# Altium footprint library ICs And Semiconductors SMD.PcbLib: 602 footprints (part 25 of 38)
Each footprint in its own frame and in the unit in brackets; x right, y up, seen from the top. Pads: shape width x height; smd on the part's side, far side on the other; paste and mask are expansions set on the pad; w line width, h text height; cw(c..) or ccw(c..) is an arc to the next point about the centre after c.
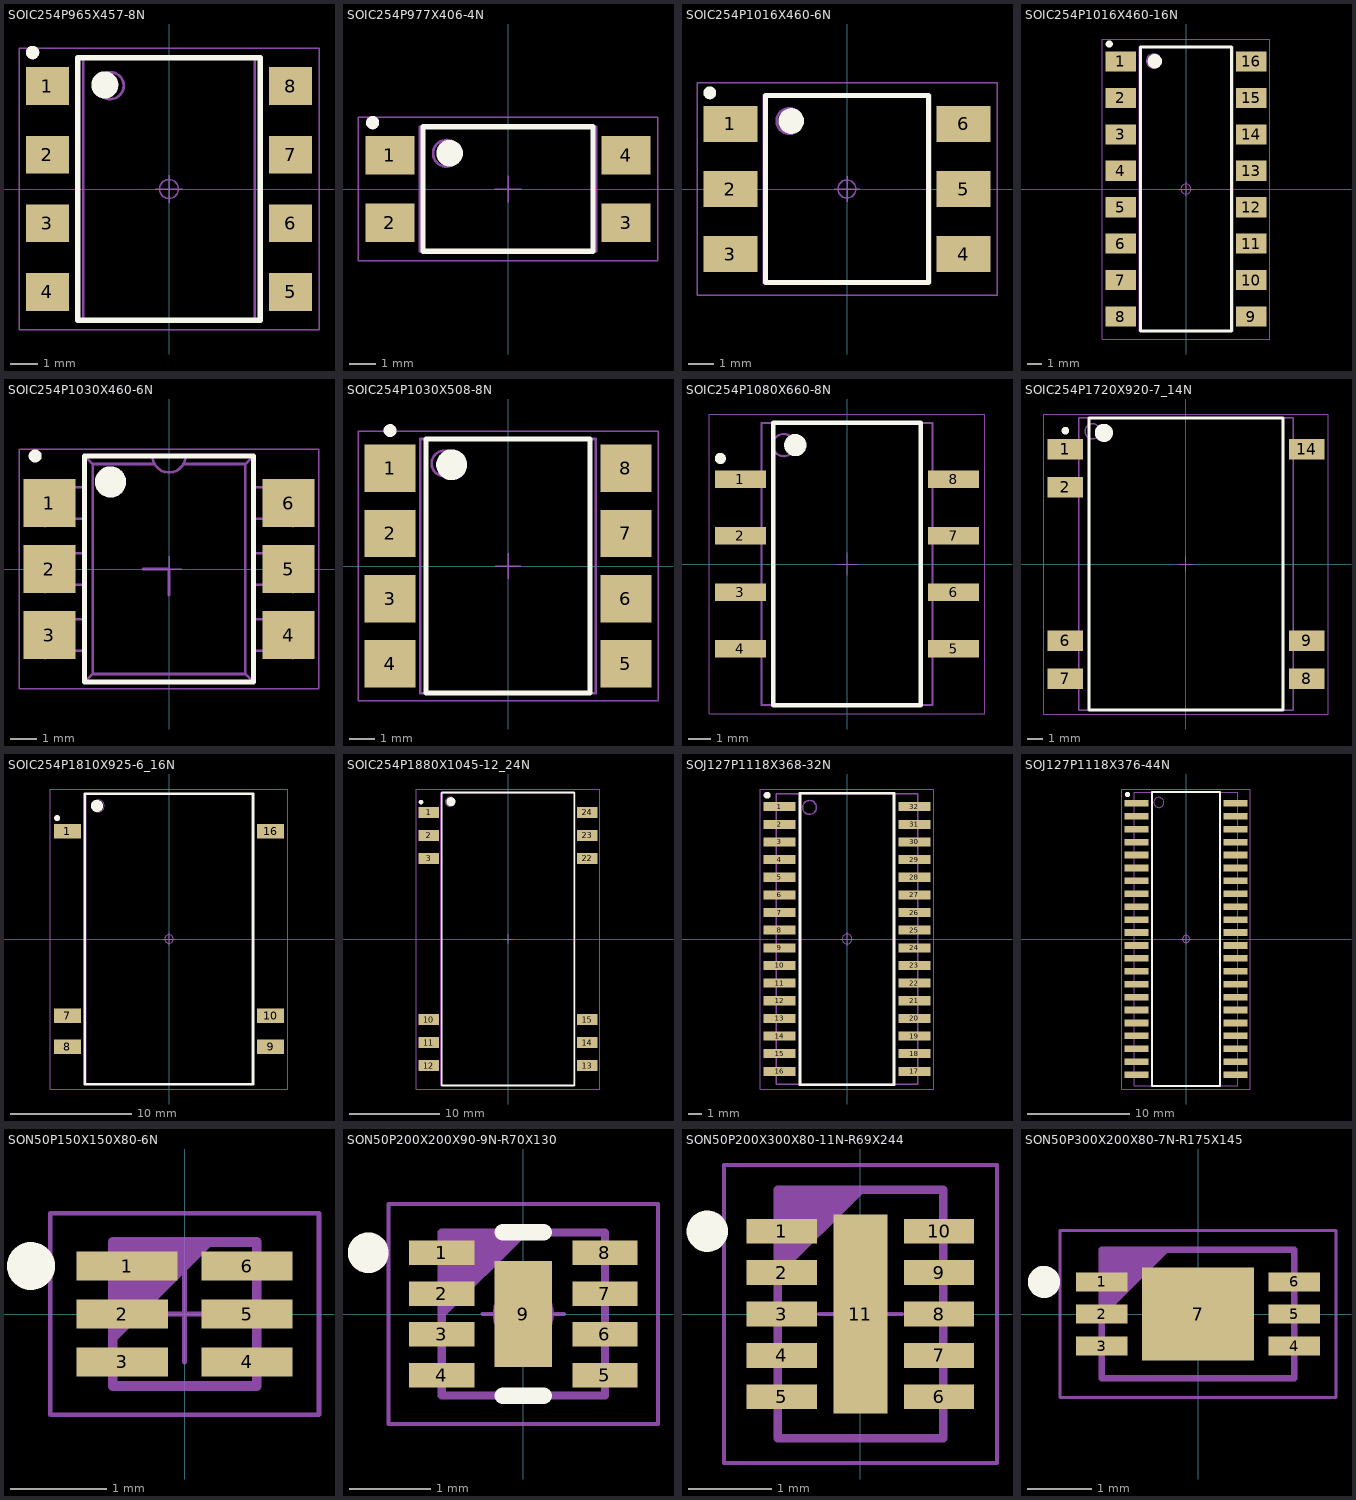
[diagram p24: the footprints below, top view; thin cyan lines are the x and y axes]

## SOIC254P965X457-8N [mm] "DIP Gull Wing Surface Mount, 8-Leads, Body 9.65 x 6.35mm (nom), Pitch 2.54mm, IPC Medium Density"
height 4.57
pads (8):
  rect 1.6x1.4 smd: 1(-4.5,3.81) 2(-4.5,1.27) 3(-4.5,-1.27) 4(-4.5,-3.81) 5(4.5,-3.81) 6(4.5,-1.27) 7(4.5,1.27) 8(4.5,3.81)
Top Overlay:
  circle w0.25: c-5.05,5.05 r0.125
  circle w0.5: c-2.375,3.85 r0.25
  lines w0.2: -3.375,-4.85 -3.375,4.85 3.375,4.85 3.375,-4.85 -3.375,-4.85
Mechanical 14:
  circle w0.1: c-2.175,3.825 r0.5
  lines w0.1: -3.175,-4.825 -3.175,4.825 3.175,4.825 3.175,-4.825 -3.175,-4.825
Mechanical 15:
  circle w0.05: c0,0 r0.35
  lines w0.05: -0.5,0 0.5,0 ; 0,-0.5 0,0.5 ; -5.55,-5.2 -5.55,5.2 5.55,5.2 5.55,-5.2 -5.55,-5.2
3D body "SOIC254P965X457-8N.stp": height 4.57, standoff -0.02, extent -4.81,-4.94 4.81,4.97

## SOIC254P977X406-4N [mm] "SOIC, 2.54mm pitch; 4 pin, 6.65mm W X 4.69mm L, IPC Medium Density"
height 4.06
pads (4):
  rect 1.85x1.45 smd: 1(-4.45,1.27) 2(-4.45,-1.27) 3(4.45,-1.27) 4(4.45,1.27)
Top Overlay:
  circle w0.5: c-2.2,1.35 r0.25
  circle w0.25: c-5.1,2.5 r0.125
  lines w0.2: -3.2,-2.35 3.2,-2.35 3.2,2.35 -3.2,2.35 -3.2,-2.35
Mechanical 14:
  circle w0.1: c-2.322,1.345 r0.5
  lines w0.1: -3.322,-2.345 -3.322,2.345 3.322,2.345 3.322,-2.345 -3.322,-2.345
Mechanical 15:
  lines w0.05: -0.5,0 0.5,0 ; 0,-0.5 0,0.5 ; -5.65,-2.7 -5.65,2.7 5.65,2.7 5.65,-2.7 -5.65,-2.7
3D body "SOIC254P977X406-4N.stp": height 4.06, standoff 0, extent -5.015,-2.415 5.015,2.415

## SOIC254P1016X460-6N [mm] "DIP Gull Wing Surface Mount, 6-Leads, Body 7.3x6.5mm, Pitch 2.54mm, IPC Medium Density"
height 4.6
pads (6):
  rect 2.1x1.4 smd: 1(-4.55,2.54) 2(-4.55,0) 3(-4.55,-2.54) 4(4.55,-2.54) 5(4.55,0) 6(4.55,2.54)
Top Overlay:
  circle w0.25: c-5.35,3.75 r0.125
  circle w0.5: c-2.175,2.65 r0.25
  lines w0.2: -3.175,-3.65 -3.175,3.65 3.175,3.65 3.175,-3.65 -3.175,-3.65
Mechanical 14:
  circle w0.1: c-2.25,2.65 r0.5
  lines w0.1: -3.25,-3.65 -3.25,3.65 3.25,3.65 3.25,-3.65 -3.25,-3.65
Mechanical 15:
  circle w0.05: c0,0 r0.35
  lines w0.05: -0.5,0 0.5,0 ; 0,-0.5 0,0.5 ; -5.85,-4.15 -5.85,4.15 5.85,4.15 5.85,-4.15 -5.85,-4.15
3D body "SOIC254P1016X460-6N.stp": height 4.6, standoff 0, extent -5.15,-3.9 5.15,3.9

## SOIC254P1016X460-16N [mm] "SOIC, 2.54mm Pitch; 16 Pin, 6.50mm W X 19.84mm L X 4.60mm H body, Pitch 2.54mm, IPC Medium Density"
height 4.6
pads (16):
  rect 2.1x1.4 smd: 1(-4.55,8.89) 2(-4.55,6.35) 3(-4.55,3.81) 4(-4.55,1.27) 5(-4.55,-1.27) 6(-4.55,-3.81) 7(-4.55,-6.35) 8(-4.55,-8.89) 9(4.55,-8.89) 10(4.55,-6.35) 11(4.55,-3.81) 12(4.55,-1.27) 13(4.55,1.27) 14(4.55,3.81) 15(4.55,6.35) 16(4.55,8.89)
Top Overlay:
  circle w0.5: c-2.175,8.9 r0.25
  circle w0.25: c-5.35,10.1 r0.125
  lines w0.2: -3.175,-9.9 3.175,-9.9 3.175,9.9 -3.175,9.9 -3.175,-9.9
Mechanical 14:
  circle w0.1: c-2.25,8.92 r0.5
  lines w0.1: -3.25,-9.92 3.25,-9.92 3.25,9.92 -3.25,9.92 -3.25,-9.92
Mechanical 15:
  circle w0.05: c0,0 r0.35
  lines w0.05: -0.5,0 0.5,0 ; 0,-0.5 0,0.5 ; -5.85,-10.45 5.85,-10.45 5.85,10.45 -5.85,10.45 -5.85,-10.45
3D body "SOIC254P1016X460-16N.stp": height 4.6, standoff 0, extent -5.15,-10.17 5.15,10.17

## SOIC254P1030X460-6N [mm] "DIP Gull Wing Surface Mount, 6-Leads, Body 8.7x6.5mm (max), Pitch 2.54mm, IPC Medium Density"
height 4.6
pads (6):
  rect 2x1.85 smd: 1(-4.6,2.54) 2(-4.6,0) 3(-4.6,-2.54) 4(4.6,-2.54) 5(4.6,0) 6(4.6,2.54)
Top Overlay:
  circle w0.6: c-2.25,3.35 r0.3
  circle w0.25: c-5.15,4.35 r0.125
  lines w0.2: -3.25,-4.35 -3.25,4.35 3.25,4.35 3.25,-4.35 -3.25,-4.35
Mechanical 8:
  lines w0.1: -5.525,-2.54 -4.763,-2.54 -4.763,-3.43 ; -5.525,0 -4.763,0 -4.763,-0.89 ; -5.525,2.54 -4.763,2.54 -4.763,1.65 ; -3.25,-4.35 -2.941,-4.041 ; -3.25,-3.15 -4,-3.15 -4.09,-2.815 -5.15,-2.815 -5.15,-2.265 -4.09,-2.265 -4,-1.93 -3.25,-1.93 ; -3.25,-0.61 -4,-0.61 -4.09,-0.275 -5.15,-0.275 -5.15,0.275 -4.09,0.275 -4,0.61 -3.25,0.61 ; -3.25,1.93 -4,1.93 -4.09,2.265 -5.15,2.265 -5.15,2.815 -4.09,2.815 -4,3.15 -3.25,3.15 ; -3.25,4.35 -2.941,4.041 ; -1,0 0,0 0,-1 ; -0.635,4.35 ccw(c0,4.35) 0.635,4.35 ; -0.554,4.041 -2.941,4.041 ; 0.554,4.041 2.941,4.041 ; 3.25,-4.35 2.941,-4.041 ; 3.25,-3.15 4,-3.15 4.09,-2.815 5.15,-2.815 5.15,-2.265 4.09,-2.265 4,-1.93 3.25,-1.93 ; 3.25,-0.61 4,-0.61 4.09,-0.275 5.15,-0.275 5.15,0.275 4.09,0.275 4,0.61 3.25,0.61 ; 3.25,1.93 4,1.93 4.09,2.265 5.15,2.265 5.15,2.815 4.09,2.815 4,3.15 3.25,3.15 ; 3.25,4.35 2.941,4.041 ; 4,-2.54 4.763,-2.54 4.763,-3.43 ; 4,0 4.763,0 4.763,-0.89 ; 4,2.54 4.763,2.54 4.763,1.65 ; -2.941,-4.041 -2.941,4.041 ; -2.941,-4.041 2.941,-4.041 ; 2.941,-4.041 2.941,4.041
Mechanical 14:
  circle w0.1: c-2.25,3.35 r0.5
  lines w0.1: -3.25,-4.35 -3.25,4.35 3.25,4.35 3.25,-4.35 -3.25,-4.35
Mechanical 15:
  lines w0.05: -5.773,4.6 -5.773,-4.6 5.773,-4.6 5.773,4.6 -5.75,4.6 ; -0.5,0 0.5,0 ; 0,-0.5 0,0.5
3D body "SOIC254P1030X460-6N.stp": height 4.6, standoff 0, extent -5.15,-4.35 5.15,4.35

## SOIC254P1030X508-8N [mm] "DIP Gull Wing Surface Mount, 8-Leads, Body 9.9x6.9mm (max), Pitch 2.54mm, IPC Medium Density"
height 5.08
pads (8):
  rect 2x1.85 smd: 1(-4.6,3.81) 2(-4.6,1.27) 3(-4.6,-1.27) 4(-4.6,-3.81) 5(4.6,-3.81) 6(4.6,-1.27) 7(4.6,1.27) 8(4.6,3.81)
Top Overlay:
  circle w0.6: c-2.2,3.95 r0.3
  circle w0.25: c-4.6,5.285 r0.125
  lines w0.2: -3.2,-4.95 3.2,-4.95 3.2,4.95 -3.2,4.95 -3.2,-4.95
Mechanical 14:
  circle w0.1: c-2.48,4.005 r0.5
  lines w0.1: -3.43,-4.955 3.43,-4.955 3.43,4.955 -3.43,4.955 -3.43,-4.955
Mechanical 15:
  lines w0.05: -0.5,0 0.5,0 ; 0,-0.5 0,0.5 ; -5.85,-5.25 5.85,-5.25 5.85,5.25 -5.85,5.25 -5.85,-5.25
3D body "SOIC254P1030X508-8N.stp": height 5.08, standoff 0, extent -5.15,-4.955 5.15,4.955

## SOIC254P1080X660-8N [mm] "SOIC, 2.54mm,pitch; 8 pin, 7.70mm W X 12.70mm L X 6.60mm H body, IPC Medium Density"
height 6.6
pads (8):
  rect 2.3x0.8 smd: 1(-4.8,3.81) 2(-4.8,1.27) 3(-4.8,-1.27) 4(-4.8,-3.81) 5(4.8,-3.81) 6(4.8,-1.27) 7(4.8,1.27) 8(4.8,3.81)
Top Overlay:
  circle w0.25: c-5.7,4.75 r0.125
  circle w0.5: c-2.325,5.35 r0.25
  lines w0.2: -3.325,-6.35 -3.325,6.35 3.325,6.35 3.325,-6.35 -3.325,-6.35
Mechanical 14:
  circle w0.1: c-2.85,5.35 r0.5
  lines w0.1: -3.85,-6.35 -3.85,6.35 3.85,6.35 3.85,-6.35 -3.85,-6.35
Mechanical 15:
  lines w0.05: -0.5,0 0.5,0 ; 0,-0.5 0,0.5 ; -6.2,-6.75 -6.2,6.75 6.2,6.75 6.2,-6.75 -6.2,-6.75
3D body "SOIC254P1080X660-8N.stp": height 6.6, standoff 0, extent -5.626,-6.475 5.626,6.475

## SOIC254P1720X920-7_14N [mm] "SOIC, 2.54mm pitch; 7 of 14 pin, 13.70mm W X 18.90mm L X 9.20mm H body, IPC Medium Density"
height 9.2
pads (7):
  rect 2.35x1.35 smd: 1(-8,7.62) 2(-8,5.08) 6(-8,-5.08) 7(-8,-7.62) 8(8,-7.62) 9(8,-5.08) 14(8,7.62)
Top Overlay:
  circle w0.6: c-5.45,8.7 r0.3
  circle w0.25: c-8,8.845 r0.125
  lines w0.2: -6.45,-9.7 6.45,-9.7 6.45,9.7 -6.45,9.7 -6.45,-9.7
Mechanical 14:
  circle w0.1: c-6.2,8.8 r0.5
  lines w0.1: -7.1,-9.7 7.1,-9.7 7.1,9.7 -7.1,9.7 -7.1,-9.7
Mechanical 15:
  lines w0.05: -0.5,0 0.5,0 ; 0,-0.5 0,0.5 ; -9.45,-9.95 9.45,-9.95 9.45,9.95 -9.45,9.95 -9.45,-9.95
3D body "DCDC_TRACO_TMR1SM.stp": height 9.45, standoff 0, extent -8.85,-9.7 8.85,9.7

## SOIC254P1810X925-6_16N [mm] "SOIC, 2.54mm, pitch; 6 pin, 13.70mm W X 24.00mm L X 9.25mm H body, IPC Medium Density"
height 9.25
pads (6):
  rect 2.25x1.2 smd: 1(-8.4,8.89) 7(-8.4,-6.35) 8(-8.4,-8.89) 9(8.4,-8.89) 10(8.4,-6.35) 16(8.4,8.89)
Top Overlay:
  circle w0.25: c-9.25,10 r0.125
  circle w0.5: c-5.95,11 r0.25
  lines w0.2: -6.95,-12 -6.95,12 6.95,12 6.95,-12 -6.95,-12
Mechanical 14:
  circle w0.1: c-5.85,11 r0.5
  lines w0.1: -6.85,-12 -6.85,12 6.85,12 6.85,-12 -6.85,-12
Mechanical 15:
  circle w0.05: c0,0 r0.35
  lines w0.05: -0.5,0 0.5,0 ; 0,-0.5 0,0.5 ; -9.8,-12.4 -9.8,12.4 9.8,12.4 9.8,-12.4 -9.8,-12.4
3D body "SOIC254P1810X925-6_16N.stp": height 10.45, standoff 0, extent -9.05,-12 9.05,12

## SOIC254P1880X1045-12_24N [mm] "SOIC, 2.54mm Pitch, 12 Pin of 24, 14.8 W X 32.3mm L X 10.45mm H, IPC Medium Density"
height 10.45
pads (12):
  rect 2.25x1.2 smd: 1(-8.75,13.97) 2(-8.75,11.43) 3(-8.75,8.89) 10(-8.75,-8.89) 11(-8.75,-11.43) 12(-8.75,-13.97) 13(8.75,-13.97) 14(8.75,-11.43) 15(8.75,-8.89) 22(8.75,8.89) 23(8.75,11.43) 24(8.75,13.97)
Top Overlay:
  circle w0.5: c-6.3,15.15 r0.25
  circle w0.25: c-9.6,15.1 r0.125
  lines w0.2: -7.3,-16.15 7.3,-16.15 7.3,16.15 -7.3,16.15 -7.3,-16.15
Mechanical 14:
  circle w0.1: c-6.4,15.15 r0.5
  lines w0.1: -7.4,-16.15 7.4,-16.15 7.4,16.15 -7.4,16.15 -7.4,-16.15
Mechanical 15:
  lines w0.05: -0.5,0 0.5,0 ; 0,-0.5 0,0.5 ; -10.15,-16.55 10.15,-16.55 10.15,16.55 -10.15,16.55 -10.15,-16.55
3D body "SOIC254P1880X1045-12_24N.stp": height 10.45, standoff 0, extent -9.4,-16.15 9.4,16.15

## SOJ127P1118X368-32N [mm] "SO J-Lead, 1.27mm, Pitch; 32 Pin, 10.16mm W X 20.95mm L X 3.68mm H body, IPC Medium Density"
height 3.68
pads (32):
  rect 2.3x0.65 smd: 1(-4.85,9.525) 2(-4.85,8.255) 3(-4.85,6.985) 4(-4.85,5.715) 5(-4.85,4.445) 6(-4.85,3.175) 7(-4.85,1.905) 8(-4.85,0.635) 9(-4.85,-0.635) 10(-4.85,-1.905) 11(-4.85,-3.175) 12(-4.85,-4.445) 13(-4.85,-5.715) 14(-4.85,-6.985) 15(-4.85,-8.255) 16(-4.85,-9.525) 17(4.85,-9.525) 18(4.85,-8.255) 19(4.85,-6.985) 20(4.85,-5.715) 21(4.85,-4.445) 22(4.85,-3.175) 23(4.85,-1.905) 24(4.85,-0.635) 25(4.85,0.635) 26(4.85,1.905) 27(4.85,3.175) 28(4.85,4.445) 29(4.85,5.715) 30(4.85,6.985) 31(4.85,8.255) 32(4.85,9.525)
Top Overlay:
  circle w0.25: c-5.75,10.35 r0.125
  lines w0.2: -3.375,-10.5 -3.375,10.5 3.375,10.5 3.375,-10.5 -3.375,-10.5
Mechanical 14:
  circle w0.1: c-2.7,9.475 r0.5
  lines w0.1: -5.08,-10.475 -5.08,10.475 5.08,10.475 5.08,-10.475 -5.08,-10.475
Mechanical 15:
  circle w0.05: c0,0 r0.35
  lines w0.05: -0.5,0 0.5,0 ; 0,-0.5 0,0.5 ; -6.25,-10.8 -6.25,10.8 6.25,10.8 6.25,-10.8 -6.25,-10.8
3D body "SOJ127P1118X368-32N.stp": height 3.68, standoff 0, extent -5.587,-10.54 5.588,10.54

## SOJ127P1118X376-44N [mm] "SO J-Lead, 1.27mm Pitch; 44 Pin, 10.16mm W X 28.86mm L X 3.76mm H Body, IPC Medium Density"
height 1.2
pads (44):
  rect 2.35x0.65 smd: 1(-4.85,13.335) 2(-4.85,12.065) 3(-4.85,10.795) 4(-4.85,9.525) 5(-4.85,8.255) 6(-4.85,6.985) 7(-4.85,5.715) 8(-4.85,4.445) 9(-4.85,3.175) 10(-4.85,1.905) 11(-4.85,0.635) 12(-4.85,-0.635) 13(-4.85,-1.905) 14(-4.85,-3.175) 15(-4.85,-4.445) 16(-4.85,-5.715) 17(-4.85,-6.985) 18(-4.85,-8.255) 19(-4.85,-9.525) 20(-4.85,-10.795) 21(-4.85,-12.065) 22(-4.85,-13.335) 23(4.85,-13.335) 24(4.85,-12.065) 25(4.85,-10.795) 26(4.85,-9.525) 27(4.85,-8.255) 28(4.85,-6.985) 29(4.85,-5.715) 30(4.85,-4.445) 31(4.85,-3.175) 32(4.85,-1.905) 33(4.85,-0.635) 34(4.85,0.635) 35(4.85,1.905) 36(4.85,3.175) 37(4.85,4.445) 38(4.85,5.715) 39(4.85,6.985) 40(4.85,8.255) 41(4.85,9.525) 42(4.85,10.795) 43(4.85,12.065) 44(4.85,13.335)
Top Overlay:
  circle w0.25: c-5.75,14.2 r0.125
  lines w0.2: -3.35,-14.45 3.35,-14.45 3.35,14.45 -3.35,14.45 -3.35,-14.45
Mechanical 14:
  circle w0.1: c-2.675,13.43 r0.5
  lines w0.1: -5.08,-14.43 5.08,-14.43 5.08,14.43 -5.08,14.43 -5.08,-14.43
Mechanical 15:
  circle w0.05: c0,0 r0.35
  lines w0.05: -0.5,0 0.5,0 ; 0,-0.5 0,0.5 ; -6.3,-14.75 6.3,-14.75 6.3,14.75 -6.3,14.75 -6.3,-14.75
3D body "SOJ127P1118X376-44N.stp": height 3.68, standoff 0, extent -5.587,-14.49 5.588,14.49

## SON50P150X150X80-6N [mm] "SON, 0.50mm pitch, 6 pin, 1.5mm X 1.5mm X 0.8mm H body,  IPC Medium Density"
height 0.8
pads (6):
  rect 1.05x0.3 smd: 1(-0.6,0.5)
  rect 0.95x0.3 smd: 2(-0.65,0) 3(-0.65,-0.5) 4(0.65,-0.5) 5(0.65,0) 6(0.65,0.5)
Top Overlay:
  circle w0.25: c-1.6,0.5 r0.125
Mechanical 14:
  lines w0.1: -0.75,-0.25 0.25,0.75 ; -0.75,-0.15 0.15,0.75 ; -0.75,-0.05 0.05,0.75 ; -0.75,0.05 -0.05,0.75 ; -0.75,0.15 -0.15,0.75 ; -0.75,0.25 -0.25,0.75 ; -0.75,0.35 -0.35,0.75 ; -0.75,0.45 -0.45,0.75 ; -0.75,0.55 -0.55,0.75 ; -0.75,0.65 -0.65,0.75 ; -0.75,-0.75 0.75,-0.75 0.75,0.75 -0.75,0.75 -0.75,-0.75
Mechanical 15:
  lines w0.05: -0.5,0 0.5,0 ; 0,-0.5 0,0.5 ; -1.4,-1.05 -1.4,1.05 1.4,1.05 1.4,-1.05 -1.4,-1.05
3D body "SON50P150X150X80-6N.stp": height 0.8, standoff 0, extent -0.774,-0.774 0.776,0.776

## SON50P200X200X90-9N-R70X130 [mm] "SON, 0.50mm Pitch; 8 Pin, 2.00mm W X 2.00mm L X 0.90mm H body (w/thermal tab 0.7 X 1.3 mm), IPC Medium Density"
height 1.1
pads (9):
  rect 0.8x0.3 smd: 1(-1,0.75) 2(-1,0.25) 3(-1,-0.25) 4(-1,-0.75) 5(1,-0.75) 6(1,-0.25) 7(1,0.25) 8(1,0.75)
  rect 0.7x1.3 smd paste-0.165: 9(0,0)
Top Overlay:
  circle w0.25: c-1.9,0.75 r0.125
  lines w0.2: -0.25,-1 0.25,-1 ; -0.25,1 0.25,1
Mechanical 14:
  lines w0.1: -1,0 0,1 ; -1,0.1 -0.1,1 ; -1,0.2 -0.2,1 ; -1,0.3 -0.3,1 ; -1,0.4 -0.4,1 ; -1,0.5 -0.5,1 ; -1,0.6 -0.6,1 ; -1,0.7 -0.7,1 ; -1,0.8 -0.8,1 ; -1,0.9 -0.9,1 ; -1,-1 1,-1 1,1 -1,1 -1,-1
Mechanical 15:
  circle w0.05: c0,0 r0.35
  lines w0.05: -0.5,0 0.5,0 ; 0,-0.5 0,0.5 ; -1.65,-1.35 -1.65,1.35 1.65,1.35 1.65,-1.35 -1.65,-1.35
3D body "SON50P200X200X90-9N-R70X130.stp": height 0.9, standoff 0, extent -1,-1 1,1

## SON50P200X300X80-11N-R69X244 [mm] "SON, 0.50mm Pitch, 10-pin, 2.00mm W  X 3mm L X 0.80mm Height, (w/thermal tab 0.69 X 2.44 mm), IPC Medium Density"
height 1.1
pads (11):
  rect 0.85x0.3 smd: 1(-0.95,1) 2(-0.95,0.5) 3(-0.95,0) 4(-0.95,-0.5) 5(-0.95,-1) 6(0.95,-1) 7(0.95,-0.5) 8(0.95,0) 9(0.95,0.5) 10(0.95,1)
  rect 0.65x2.4 smd: 11(0,0)
Top Overlay:
  circle w0.25: c-1.85,1 r0.125
Mechanical 14:
  lines w0.1: -1,0.5 0,1.5 ; -1,0.6 -0.1,1.5 ; -1,0.7 -0.2,1.5 ; -1,0.8 -0.3,1.5 ; -1,0.9 -0.4,1.5 ; -1,1 -0.5,1.5 ; -1,1.1 -0.6,1.5 ; -1,1.2 -0.7,1.5 ; -1,1.3 -0.8,1.5 ; -1,1.4 -0.9,1.5 ; -1,-1.5 1,-1.5 1,1.5 -1,1.5 -1,-1.5
Mechanical 15:
  lines w0.05: -0.5,0 0.5,0 ; 0,-0.5 0,0.5 ; -1.65,-1.8 1.65,-1.8 1.65,1.8 -1.65,1.8 -1.65,-1.8
3D body "SON50P200X300X80-11N-R69X244.stp": height 0.8, standoff 0, extent -1.05,-1.55 1.05,1.55

## SON50P300X200X80-7N-R175X145 [mm] "SON (DFN), 0.50mm pitch, 6 pin, 3mm X 2mm X 0.8mm H body (w/thermal tab 1.75 X 1.45mm),  IPC Medium Density"
height 0.8
pads (7):
  rect 0.8x0.3 smd: 1(-1.5,0.5) 2(-1.5,0) 3(-1.5,-0.5) 4(1.5,-0.5) 5(1.5,0) 6(1.5,0.5)
  rect 1.75x1.45 smd: 7(0,0)
Top Overlay:
  circle w0.25: c-2.4,0.5 r0.125
Mechanical 14:
  lines w0.1: -1.5,0 -0.5,1 ; -1.5,0.1 -0.6,1 ; -1.5,0.2 -0.7,1 ; -1.5,0.3 -0.8,1 ; -1.5,0.4 -0.9,1 ; -1.5,0.5 -1,1 ; -1.5,0.6 -1.1,1 ; -1.5,0.7 -1.2,1 ; -1.5,0.8 -1.3,1 ; -1.5,0.9 -1.4,1 ; -1.5,-1 -1.5,1 1.5,1 1.5,-1 -1.5,-1
Mechanical 15:
  circle w0.05: c0,0 r0.35
  lines w0.05: -0.5,0 0.5,0 ; 0,-0.5 0,0.5 ; -2.15,-1.3 -2.15,1.3 2.15,1.3 2.15,-1.3 -2.15,-1.3
3D body "SON50P300X200X80-7N-R175X145.stp": height 0.85, standoff 0, extent -1.55,-1.05 1.55,1.05